# Altium footprint library TarabusLib_KOR.PcbLib: 560 footprints (part 2 of 35)
Each footprint in its own frame and in the unit in brackets; x right, y up, seen from the top. Pads: shape width x height; smd on the part's side, far side on the other; paste and mask are expansions set on the pad; w line width, h text height; cw(c..) or ccw(c..) is an arc to the next point about the centre after c.
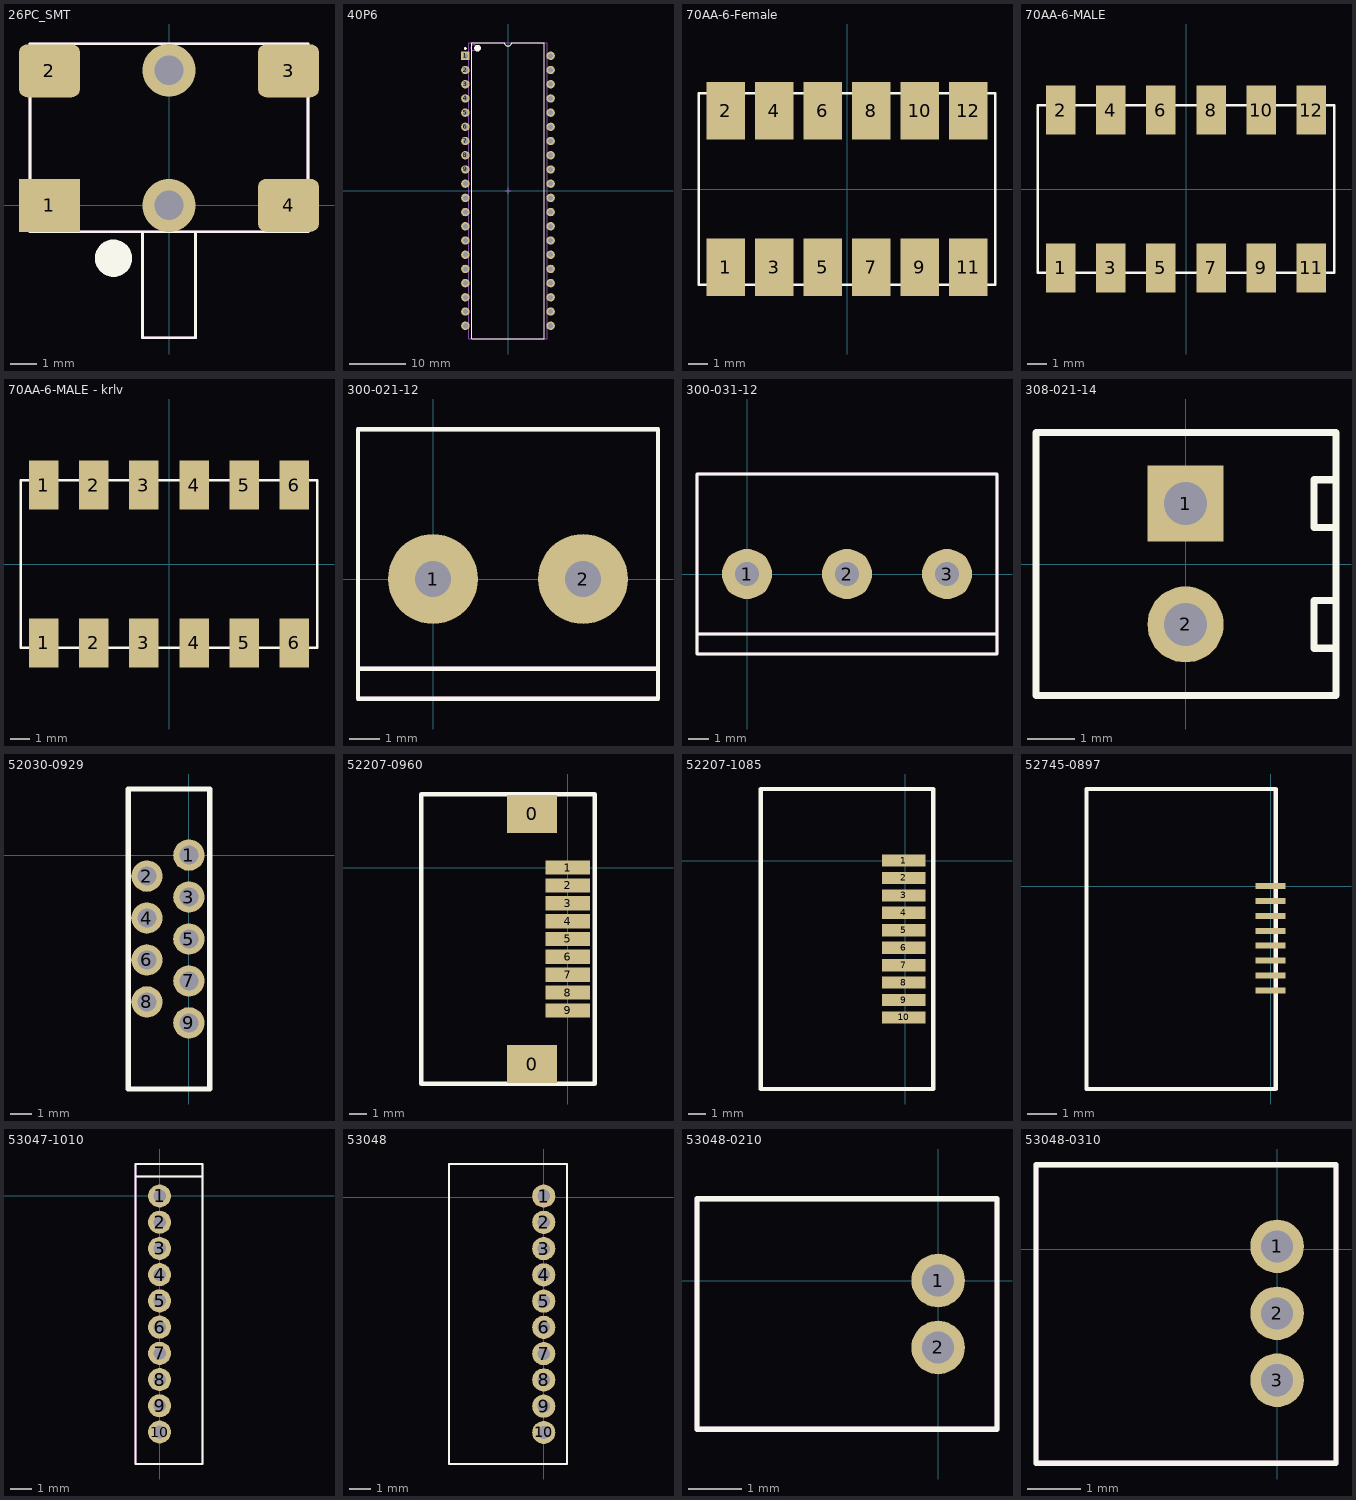
[diagram p1: the footprints below, top view; thin cyan lines are the x and y axes]

## 26PC_SMT [mm]
height 8
pads (4):
  rect 2.3x2 smd: 1(-4.515,0)
  rrect30% 2.3x2 smd: 2(-4.515,5.08) 3(4.515,5.08) 4(4.515,0)
via 0,0 diameter 2 hole 1.1
via 0,5.1 diameter 2 hole 1.1
Top Overlay:
  circle w1: c-2.1,-2 r0.2
  lines w0.1: -1,-1 -1,-5 1,-5 1,-1 ; -5.25,-1 -5.25,6.1 5.25,6.1 5.25,-1 -5.25,-1
Mechanical 7:
  lines w0.1: -1,-1 -1,-5 1,-5 1,-1 ; -5.25,-1 5.25,-1 5.25,6.1 -5.25,6.1 -5.25,-1
3D body: height 7.87, standoff 0, extent -3.4,-1 3.4,6.1
3D body: height 2.75, standoff 0, extent -5.75,-1.1 -3.275,1.1
3D body: height 2.75, standoff 0, extent -5.725,4 -3.25,6.2
3D body: height 2.75, standoff 0, extent 3.275,4 5.75,6.2
3D body: height 2.75, standoff 0, extent 3.275,-1.1 5.75,1.1
3D body: height 7, standoff 0, extent -1,-5 1,-1

## 40P6 [mm] "DIP, 40-Leads, Row Spacing 15.24mm, Pitch 2.54mm, Body 52.2x13.95mm"
height 5.72
pads (40):
  rect 1.5x1.5 hole 0.9: 1(-7.62,24.13)
  round 1.5 hole 0.9: 2(-7.62,21.59) 3(-7.62,19.05) 4(-7.62,16.51) 5(-7.62,13.97) 6(-7.62,11.43) 7(-7.62,8.89) 8(-7.62,6.35) 9(-7.62,3.81) 10(-7.62,1.27) 11(-7.62,-1.27) 12(-7.62,-3.81) 13(-7.62,-6.35) 14(-7.62,-8.89) 15(-7.62,-11.43) 16(-7.62,-13.97) 17(-7.62,-16.51) 18(-7.62,-19.05) 19(-7.62,-21.59) 20(-7.62,-24.13) 21(7.62,-24.13) 22(7.62,-21.59) 23(7.62,-19.05) 24(7.62,-16.51) 25(7.62,-13.97) 26(7.62,-11.43) 27(7.62,-8.89) 28(7.62,-6.35) 29(7.62,-3.81) 30(7.62,-1.27) 31(7.62,1.27) 32(7.62,3.81) 33(7.62,6.35) 34(7.62,8.89) 35(7.62,11.43) 36(7.62,13.97) 37(7.62,16.51) 38(7.62,19.05) 39(7.62,21.59) 40(7.62,24.13)
Top Overlay:
  circle w0.25: c-7.62,25.43 r0.125
  circle w0.6: c-5.45,25.5 r0.3
  lines w0.2: -6.45,-26.5 -6.45,26.5 -0.635,26.5 ccw(c0,26.5) 0.635,26.5 6.45,26.5 6.45,-26.5 -6.45,-26.5
Mechanical 13:
  circle w0.1: c-6.15,25.575 r0.5
  lines w0.1: -7.05,-26.475 -7.05,26.475 7.05,26.475 7.05,-26.475 -7.05,-26.475
Mechanical 15:
  lines w0.1: -0.5,0 0.5,0 ; 0,-0.5 0,0.5
3D body: height 5.72, standoff 0, extent -7.05,-26.475 7.05,26.475

## 70AA-6-Female [mm]
height 1.27
pads (12):
  rect 2x3 smd: 1(-6.35,-4.1) 2(-6.35,4.1) 3(-3.81,-4.1) 4(-3.81,4.1) 5(-1.27,-4.1) 6(-1.27,4.1) 7(1.27,-4.1) 8(1.27,4.1) 9(3.81,-4.1) 10(3.81,4.1) 11(6.35,-4.1) 12(6.35,4.1)
Top Overlay:
  lines w0.127: -7.75,-5 7.75,-5 7.75,5 -7.75,5 -7.75,-5
3D body "70AA female 6.STEP": height 1.27, standoff -0.84, extent -7.57,-5 7.57,5

## 70AA-6-MALE [mm]
height 1.27
pads (12):
  rect 1.5x2.5 smd: 1(-6.35,-4) 2(-6.35,4) 3(-3.81,-4) 4(-3.81,4) 5(-1.27,-4) 6(-1.27,4) 7(1.27,-4) 8(1.27,4) 9(3.81,-4) 10(3.81,4) 11(6.35,-4) 12(6.35,4)
Top Overlay:
  lines w0.127: -7.5,-4.25 7.5,-4.25 7.5,4.25 -7.5,4.25 -7.5,-4.25
3D body "70AA male 6.STEP": height 3.81, standoff -0.18, extent -7.58,-4.24 7.58,4.24

## 70AA-6-MALE - krlv [mm]
height 1.27
pads (12):
  rect 1.5x2.5 smd: 1(-6.35,-4) 1(-6.35,4) 2(-3.81,-4) 2(-3.81,4) 3(-1.27,-4) 3(-1.27,4) 4(1.27,-4) 4(1.27,4) 5(3.81,-4) 5(3.81,4) 6(6.35,-4) 6(6.35,4)
Top Overlay:
  lines w0.127: -7.5,-4.25 -7.5,4.25 7.5,4.25 7.5,-4.25 -7.5,-4.25
3D body "70AA male 6.STEP": height 3.81, standoff -0.18, extent -7.58,-4.24 7.58,4.24

## 300-021-12 [mm]
pads (2):
  round 3 hole 1.2: 1(0,0) 2(5,0)
Top Overlay:
  lines w0.15: -2.5,-3 7.5,-3 ; -2.5,-4 7.5,-4 7.5,5 -2.5,5 -2.5,-4
Mechanical 7:
  lines w0.15: -2.5,-3 7.5,-3 ; -2.5,-4 -2.5,5 7.5,5 7.5,-4 -2.5,-4
Mechanical 10:
  text ".Designator" at 4.52,5.25 h0.8
  text ".Comment" at 5.52,-4.71 h0.6
3D body: height 12.5, standoff 0, extent -2.5,-4 7.5,5

## 300-031-12 [mm]
height 8.4
pads (3):
  round 2.5 hole 1.2: 1(0,0) 2(5,0) 3(10,0)
Top Overlay:
  lines w0.15: -2.5,-3 12.5,-3 ; -2.5,-4 12.5,-4 12.5,5 -2.5,5 -2.5,-4
Mechanical 7:
  lines w0.15: -2.5,-3 12.5,-3 ; -2.5,-4 -2.5,5 12.5,5 12.5,-4 -2.5,-4
Mechanical 9:
  text ".Designator" at -3.2,4.4 h0.7
  text ".Comment" at -3.1,-1.2 h0.7
3D body "terminal_blocks_a-tb500-ta03.stp": height 12.5, standoff -3.8, extent -3.1,-4 12.5,5

## 308-021-14 [mm]
height 8.5
pads (2):
  rect 1.6x1.6 hole 0.9: 1(0,1.27)
  round 1.6 hole 0.9: 2(0,-1.27)
Top Overlay:
  lines w0.15: 3.16,-1.77 2.7,-1.77 2.7,-0.77 3.16,-0.77 ; 3.16,0.77 2.7,0.77 2.7,1.77 3.16,1.77 ; -3.14,-2.765 3.16,-2.765 3.16,2.765 -3.14,2.765 -3.14,-2.765
Mechanical 7:
  lines w0.1: 3.16,-1.77 2.7,-1.77 2.7,-0.77 3.16,-0.77 ; 3.16,0.77 2.7,0.77 2.7,1.77 3.16,1.77 ; -3.14,-2.765 -3.14,2.765 3.16,2.765 3.16,-2.765 -3.14,-2.765
Mechanical 10:
  text ".Designator" at -1.175,3.975 h0.8
  text ".Comment" at -1.15,3.275 h0.6
3D body: height 8.5, standoff 0, extent -3.14,-2.765 3.16,2.765

## 52030-0929 [mm] "Molex"
pads (9):
  round 1.5 hole 0.9 mask+0: 1(0,0) 2(-2,-1) 3(0,-2) 4(-2,-3) 5(0,-4) 6(-2,-5) 7(0,-6) 8(-2,-7) 9(0,-8)
Top Overlay:
  lines w0.254: -2.9,-11.15 1,-11.15 1,3.15 -2.9,3.15 -2.9,-11.15
3D body "520300929.stp": height 6.7, standoff -3.2, extent -2.7,-11.15 0.8,3.15

## 52207-0960 [mm]
pads (11):
  rect 2.8x2.1 smd: 0(-2,-11) 0(-2,3)
  rect 2.5x0.8 smd mask+0: 1(0,0) 2(0,-1) 3(0,-2) 4(0,-3) 5(0,-4) 6(0,-5) 7(0,-6) 8(0,-7) 9(0,-8)
Top Overlay:
  lines w0.254: -8.2,-12.1 -8.2,4.1 1.5,4.1 1.5,-12.1 -8.2,-12.1
3D body "5545.stp": height 2.75, standoff 0.05, extent -7.9,-11.65 1,3.65

## 52207-1085 [mm]
pads (10):
  rect 2.5x0.7 smd mask+0: 1(-0.1,0) 2(-0.1,-1) 3(-0.1,-2) 4(-0.1,-3) 5(-0.1,-4) 6(-0.1,-5) 7(-0.1,-6) 8(-0.1,-7) 9(-0.1,-8) 10(-0.1,-9)
Top Overlay:
  lines w0.254: -8.3,-13.1 -8.3,4.1 1.6,4.1 1.6,-13.1 -8.3,-13.1
3D body "5547.stp": height 2.75, standoff 0.05, extent -8,-12.65 0.9,3.65

## 52745-0897 [mm]
pads (8):
  rect 1x0.2 smd mask+0: 1(0,0) 2(0,-0.5) 3(0,-1) 4(0,-1.5) 5(0,-2) 6(0,-2.5) 7(0,-3) 8(0,-3.5)
Top Overlay:
  lines w0.15: -6.18,-6.81 -6.18,3.26 0.18,3.26 0.18,-6.81 -6.18,-6.81
3D body "527450897.stp": height 2, standoff 0, extent -6.18,-6.81 0.22,3.29

## 53047-1010 [mm]
pads (10):
  round 1.1 hole 0.6 mask+0: 1(0,0) 2(0,-1.25) 3(0,-2.5) 4(0,-3.75) 5(0,-5) 6(0,-6.25) 7(0,-7.5) 8(0,-8.75) 9(0,-10) 10(0,-11.25)
Top Overlay:
  lines w0.1: -1.15,0.925 2.05,0.925 ; -1.15,-12.775 -1.15,1.525 2.05,1.525 2.05,-12.775 -1.15,-12.775
Mechanical 7:
  lines w0.1: -1.15,0.925 2.05,0.925 ; -1.15,-12.775 2.05,-12.775 2.05,1.525 -1.15,1.525 -1.15,-12.775
3D body "530471010.stp": height 4.1, standoff -2.3, extent -1.2,-12.725 2,1.525

## 53048 [mm]
pads (10):
  round 1.1 hole 0.6 mask+0: 1(0,0.05) 2(0,-1.2) 3(0,-2.45) 4(0,-3.7) 5(0,-4.95) 6(0,-6.2) 7(0,-7.45) 8(0,-8.7) 9(0,-9.95) 10(0,-11.2)
Top Overlay:
  lines w0.1: -4.5,-12.7 1.1,-12.7 1.1,1.575 -4.5,1.575 -4.5,-12.7
Mechanical 7:
  lines w0.1: -4.5,-12.7 -4.5,1.575 1.1,1.575 1.1,-12.7 -4.5,-12.7
3D body "5738.stp": height 1.75, standoff -4.05, extent -4.45,-12.625 1.05,1.625

## 53048-0210 [mm]
pads (2):
  round 1 hole 0.6 mask+0: 1(0,0) 2(0,-1.25)
Top Overlay:
  lines w0.1: -4.5,-2.775 1.1,-2.775 1.1,1.525 -4.5,1.525 -4.5,-2.775
Mechanical 11:
  lines w0.1: -4.5,-2.775 -4.5,1.525 1.1,1.525 1.1,-2.775 -4.5,-2.775
3D body "User Library-53048-0210.STEP": height 3.5, standoff -2.4, extent -4.45,-2.775 1.05,1.475

## 53048-0310 [mm]
pads (3):
  round 1 hole 0.6 mask+0: 1(0,0.05) 2(0,-1.2) 3(0,-2.45)
Top Overlay:
  lines w0.1: -4.5,-4 -4.5,1.575 1.1,1.575 1.1,-4 -4.5,-4
Mechanical 7:
  lines w0.1: -4.5,-4 1.1,-4 1.1,1.575 -4.5,1.575 -4.5,-4
3D body "5731.stp": height 3.55, standoff -2.25, extent -4.45,-3.95 1.05,1.55